# Altium footprint library 7-Pcblib_Power.PcbLib: 31 footprints (part 1 of 2)
Each footprint in its own frame and in the unit in brackets; x right, y up, seen from the top. Pads: shape width x height; smd on the part's side, far side on the other; paste and mask are expansions set on the pad; w line width, h text height; cw(c..) or ccw(c..) is an arc to the next point about the centre after c.
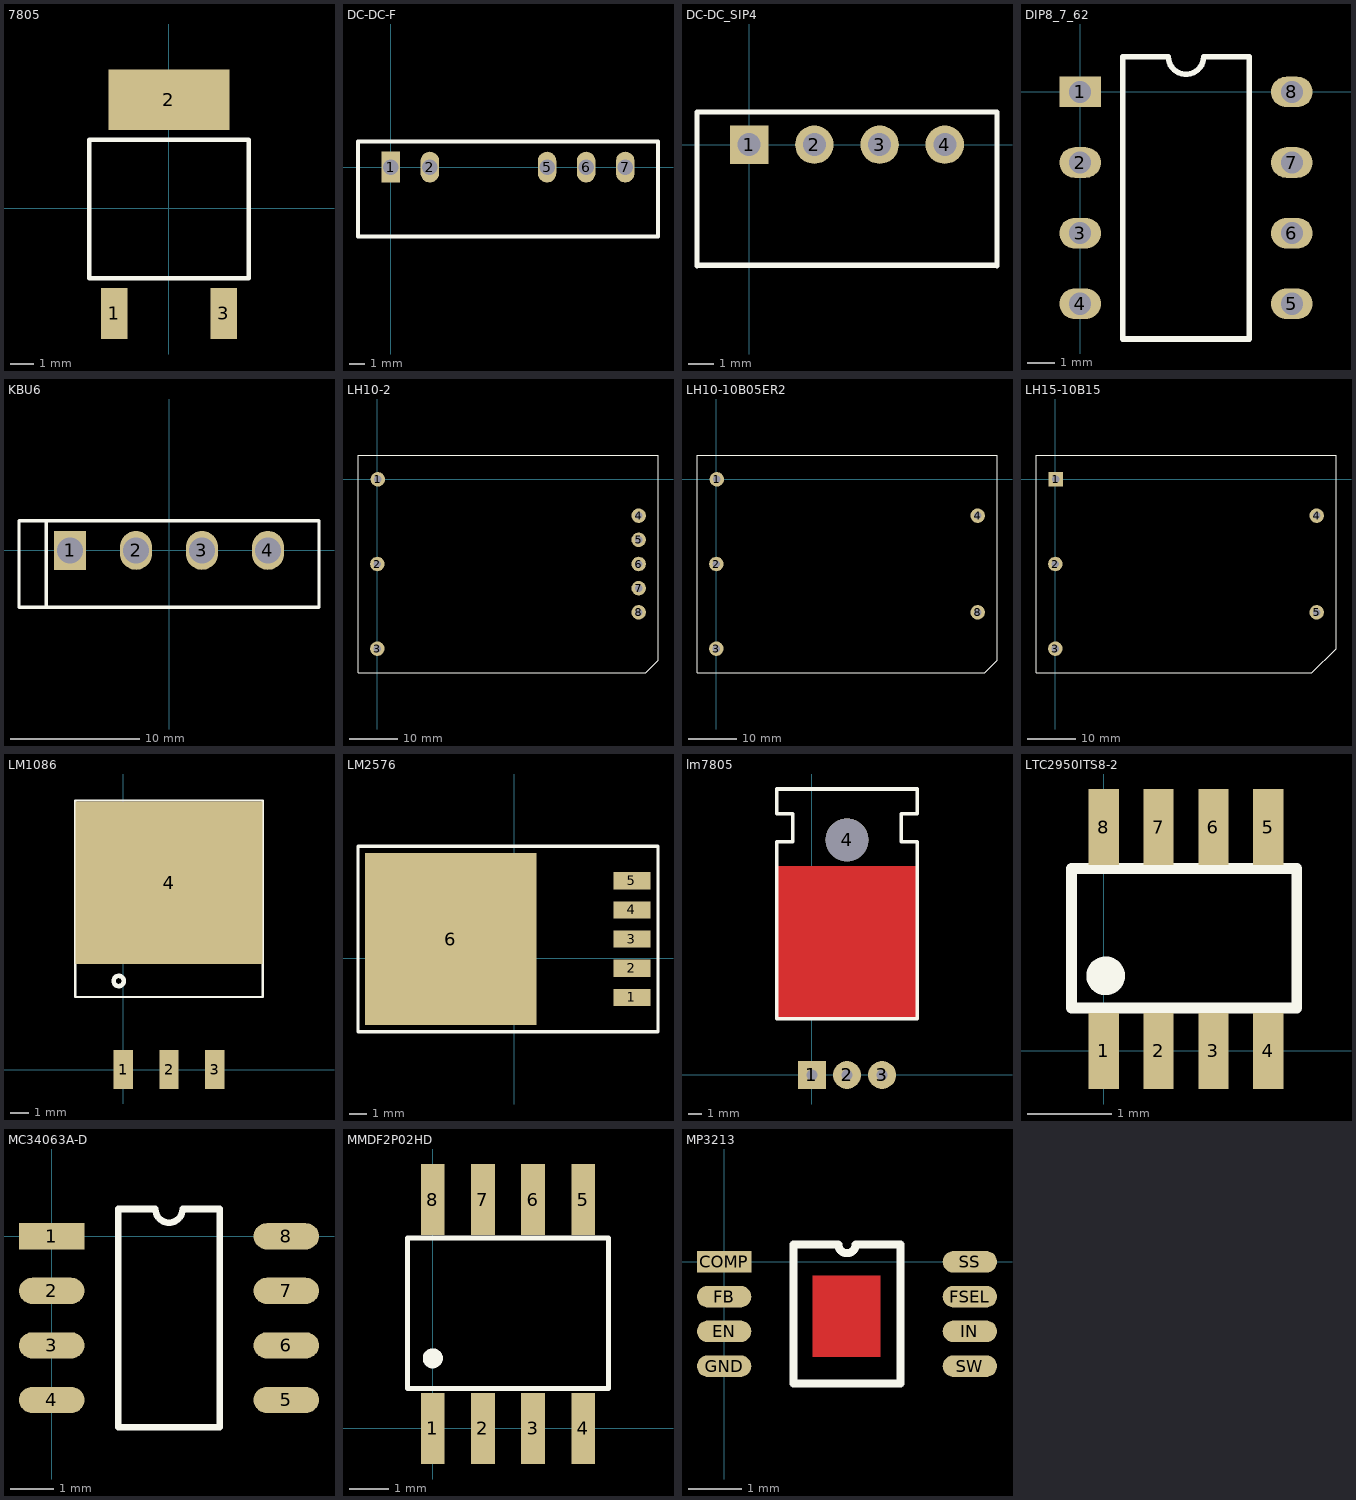
[diagram p0: the footprints below, top view; thin cyan lines are the x and y axes]

## 7805 [mm]
pads (3):
  rect 1.1x2.15 smd: 1(-2.3,-4.407) 3(2.3,-4.407)
  rect 5.08x2.54 smd: 2(0,4.572)
Top Overlay:
  lines w0.2: -3.35,-2.933 3.35,-2.933 3.35,2.883 -3.35,2.883 -3.35,-2.933
3D body: height 2.39, standoff -0.02, extent -3.245,-4.845 3.295,5.093

## BRIDGE-DB104S [mm]
3D body: height 3.35, standoff 0, extent -4.383,-4.55 5.551,4.6

## DC-DC-F [mm]
height 1.35
pads (5):
  rect 1.2x2 hole 1: 1(0,0)
  oval 1.2x2 hole 1: 2(2.54,0) 5(10.16,0) 6(12.7,0) 7(15.24,0)
Top Overlay:
  lines w0.254: -2.13,-4.5 -2.13,1.65 17.37,1.65 17.37,-4.5 -2.13,-4.5
3D body: height 9.6, standoff -3.4, extent -2.143,-4.394 17.357,1.616

## DC-DC_SIP4 [mm]
pads (4):
  rect 1.5x1.5 hole 0.9: 1(0,0)
  round 1.5 hole 0.9: 2(2.54,0) 3(5.08,0) 4(7.62,0)
Top Overlay:
  lines w0.2: -2.032,-4.73 -2.032,1.27 9.568,1.27 ; -2.032,-4.699 9.568,-4.699 ; 9.652,-4.73 9.652,1.27
3D body: height 10, standoff -4.1, extent -1.99,-5.032 9.61,0.968

## DIP8_7_62 [mm]
pads (8):
  rect 1.5x1.1 hole 0.8: 1(0,0)
  oval 1.5x1.1 hole 0.8: 2(0,-2.54) 3(0,-5.08) 4(0,-7.62) 5(7.62,-7.62) 6(7.62,-5.08) 7(7.62,-2.54) 8(7.62,0)
Top Overlay:
  lines w0.2: 1.535,-8.89 6.085,-8.89 6.085,1.27 4.445,1.27 cw(c3.81,1.27) 3.175,1.27 1.535,1.27 1.535,-8.89
3D body: height 4.5, standoff -3.5, extent -0.141,-9.21 7.62,1.59

## KBU6 [mm]
pads (4):
  rect 2.5x3 hole 2: 1(-7.65,0)
  oval 2.5x3 hole 2: 2(-2.55,0) 3(2.55,0) 4(7.65,0)
Top Overlay:
  lines w0.254: -9.5,-4.4 -9.5,2.3 ; -11.6,-4.4 11.6,-4.4 11.6,2.3 -11.6,2.3 -11.6,-4.4
3D body: height 25.65, standoff -19.65, extent -11.562,-4.572 11.638,2.378

## LH10-2 [mm] "金升阳10W AC/DC电源模块"
height 22.5
pads (8):
  round 3 hole 1.5: 1(0.1,0) 2(0,-17.5) 3(0,-35) 4(54,-7.5) 5(54,-12.5) 6(54,-17.5) 7(54,-22.5) 8(54,-27.5)
Top Overlay:
  lines w0.254: -4,-40 -4,5 58,5 58,-37.428 55.428,-40 -4,-40
3D body: height 30.5, standoff -6.75, extent -3.949,-40.03 58.051,4.97

## LH10-10B05ER2 [mm] "金升阳10W AC/DC电源模块"
height 22.5
pads (5):
  round 3 hole 1.5: 1(0.1,0) 2(0,-17.5) 3(0,-35) 4(54,-7.5) 8(54,-27.5)
Top Overlay:
  lines w0.254: -4,-40 55.428,-40 58,-37.428 58,5 -4,5 -4,-40
3D body: height 30.5, standoff -6.75, extent -3.949,-40.03 58.051,4.97

## LH15-10B15 [mm] "金?"
height 22.5
pads (5):
  rect 3x3 hole 1.5: 1(0.1,0)
  round 3 hole 1.5: 2(0,-17.5) 3(0,-35) 4(54,-7.5) 5(54,-27.5)
Top Overlay:
  lines w0.254: -4,-40 53,-40 58,-35 58,5 -4,5 -4,-40
3D body: height 30.5, standoff -6.75, extent -3.885,-40.111 58.114,4.889

## LM1086 [mm]
pads (4):
  rect 1.07x2.16 smd: 1(0,0) 2(2.54,0) 3(5.08,0)
  rect 10.414x9.017 smd: 4(2.54,10.382)
Top Overlay:
  circle w0.254: c-0.254,4.921 r0.284
  lines w0.127: -2.667,13.43 -2.667,14.954 7.747,14.954 7.747,13.43 ; -2.667,13.43 -2.667,4.032 7.747,4.032 7.747,13.43 ; -2.667,13.43 7.747,13.43

## LM2576 [mm]
pads (6):
  rect 2.16x1 smd: 1(6.859,-2.297) 2(6.859,-0.597) 3(6.859,1.103) 4(6.859,2.803) 5(6.859,4.503)
  rect 10x10 smd: 6(-3.691,1.103)
Top Overlay:
  lines w0.2: 1.255,-4.293 -9.095,-4.293 -9.095,6.507 1.315,6.507
  lines w0.203: 1.255,-4.293 8.38,-4.293 8.38,6.507 1.315,6.507
3D body: height 4.48, standoff 0, extent -7.264,-4.045 7.087,6.179

## lm7805 [mil]
pads (4):
  rect 80x80 hole 32: 1(0,0)
  round 80 hole 32: 2(100,0) 3(200,0)
  round 122.05 hole 122.05: 4(100,670)
Top Layer:
  rectangle: -100,160 300,595
Top Overlay:
  lines w10: 100,160 -100,160 -100,665 -55,665 -55,745 -100,745 -100,815 300,815 300,745 255,745 255,665 300,665 300,160 105,160

## LTC2950ITS8-2 [mm]
pads (8):
  rect 0.36x0.9 smd: 1(0,0) 2(0.65,0) 3(1.3,0) 4(1.95,0) 5(1.95,2.65) 6(1.3,2.65) 7(0.65,2.65) 8(0,2.65)
Top Overlay:
  circle w0.254: c0.025,0.889 r0.102
  lines w0.127: -0.381,0.508 2.286,0.508 2.286,2.159 -0.381,2.159 -0.381,0.508

## MC34063A-D [mil]
pads (8):
  rect 60x24 smd: 1(0,0)
  oval 60x24 smd: 2(0,-50) 3(0,-100) 4(0,-150) 5(215,-150) 6(215,-100) 7(215,-50) 8(215,0)
Top Overlay:
  lines w6: 61,-175 154,-175 154,25 120,25 cw(c107.5,25) 95,25 61,25 61,-175

## MMDF2P02HD [mm]
pads (8):
  rect 0.6x1.8 smd: 1(0,0) 2(1.27,0) 3(2.54,0) 4(3.81,0) 5(3.81,5.8) 6(2.54,5.8) 7(1.27,5.8) 8(0,5.8)
Top Overlay:
  circle w0.254: c0,1.778 r0.127
  lines w0.127: -0.635,1.016 -0.635,4.826 4.445,4.826 4.445,1.016 -0.635,1.016

## MP3213 [mil]
height 43
pads (8):
  rect 40x16 smd: COMP(0,0)
  oval 40x16 smd: EN(0,-51.2) FB(0,-25.6) FSEL(181,-25.6) GND(0,-76.8) IN(181,-51.2) SS(181,0) SW(181,-76.8)
Top Layer:
  rectangle: 65,-70 115,-10
Top Overlay:
  lines w6: 51,-89.6 130,-89.6 130,12.8 96.9,12.8 cw(c90.5,12.8) 84.1,12.8 51,12.8 51,-89.6